# Altium footprint library PcbLib1.PcbLib: 157 footprints (part 5 of 10)
Each footprint in its own frame and in the unit in brackets; x right, y up, seen from the top. Pads: shape width x height; smd on the part's side, far side on the other; paste and mask are expansions set on the pad; w line width, h text height; cw(c..) or ccw(c..) is an arc to the next point about the centre after c.
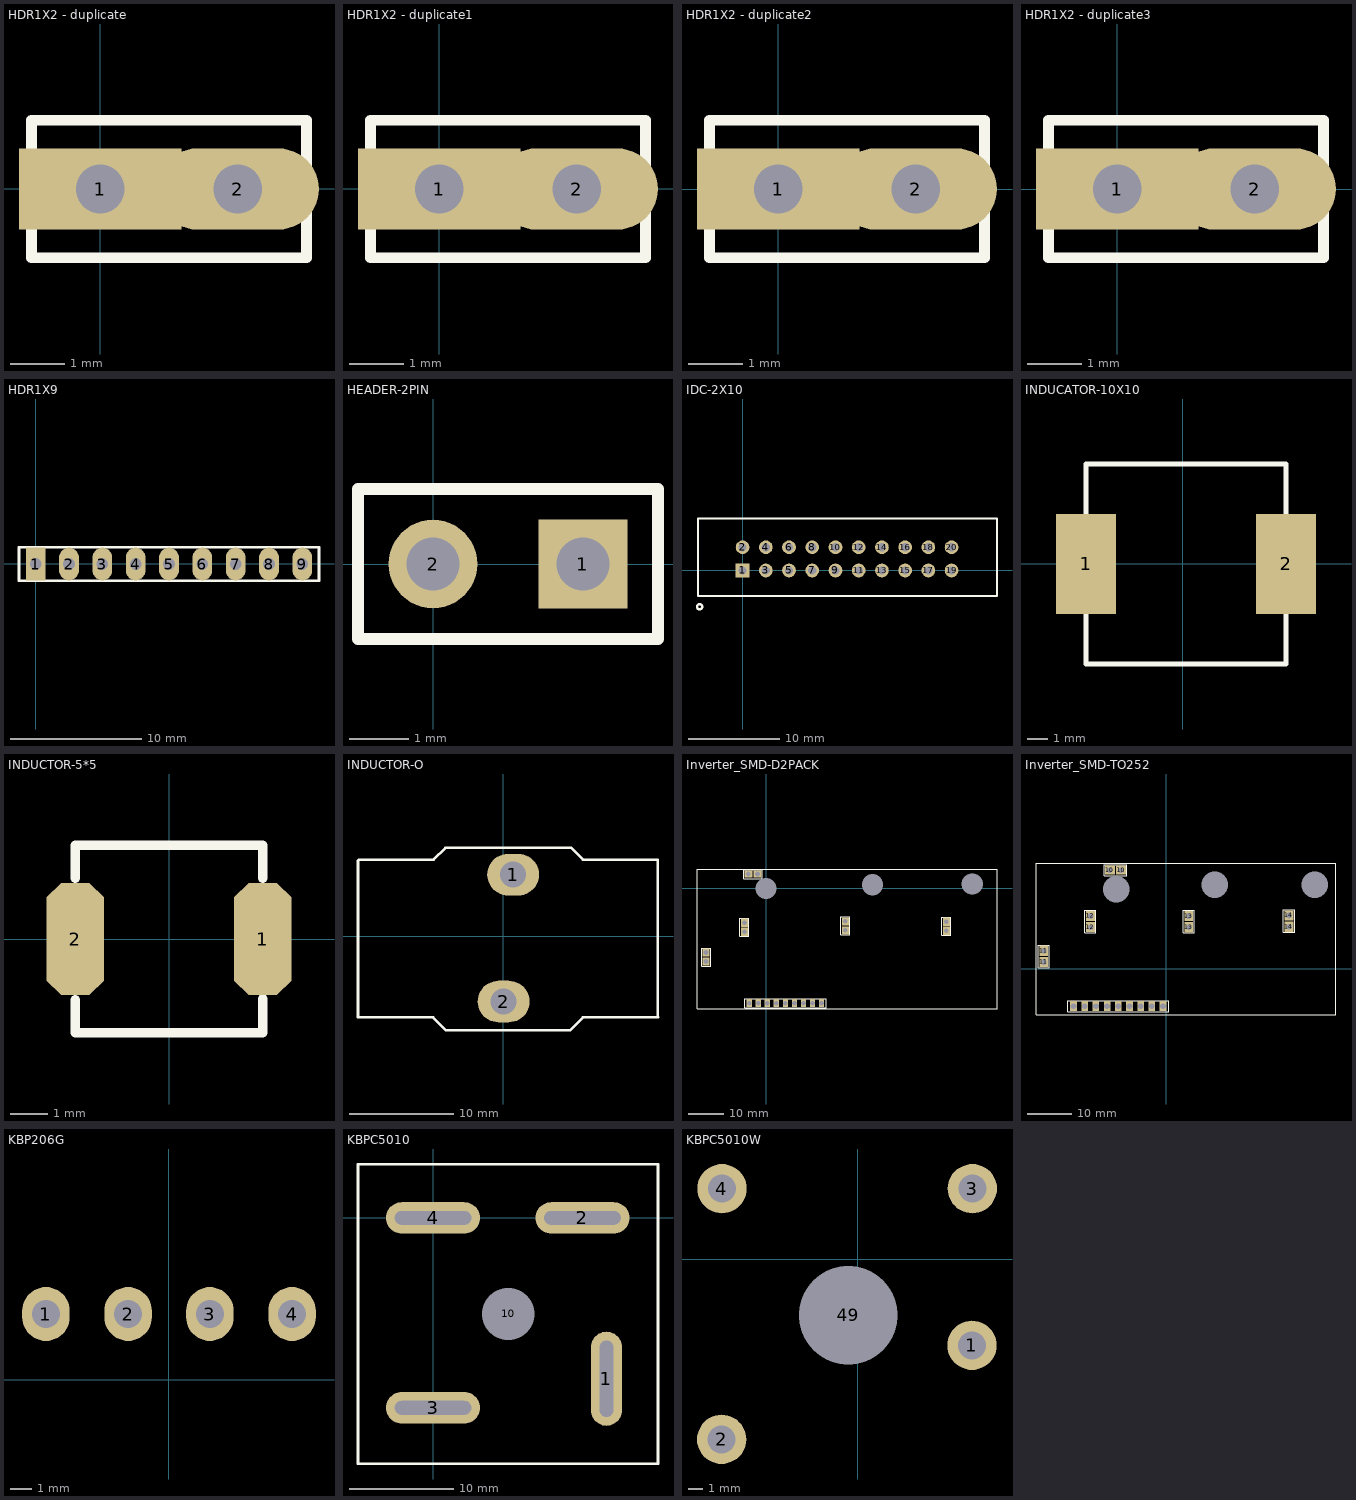
[diagram p4: the footprints below, top view; thin cyan lines are the x and y axes]

## HDR1X2 [mm] "Connector; Header; 2 Position"
height 1.12

## HDR1X2 - duplicate [mm] "Connector; Header; 2 Position"
height 1.12
pads (2):
  rect 3x1.5 hole 0.9: 1(0,0)
  oval 3x1.5 hole 0.9: 2(2.54,0)
Top Overlay:
  lines w0.2: -1.27,-1.27 3.81,-1.27 3.81,1.27 -1.27,1.27 -1.27,-1.27

## HDR1X2 - duplicate1 [mm] "Connector; Header; 2 Position"
height 1.12
pads (2):
  rect 3x1.5 hole 0.9: 1(0,0)
  oval 3x1.5 hole 0.9: 2(2.54,0)
Top Overlay:
  lines w0.2: -1.27,-1.27 -1.27,1.27 3.81,1.27 3.81,-1.27 -1.27,-1.27

## HDR1X2 - duplicate2 [mm] "Connector; Header; 2 Position"
height 1.12
pads (2):
  rect 3x1.5 hole 0.9: 1(0,0)
  oval 3x1.5 hole 0.9: 2(2.54,0)
Top Overlay:
  lines w0.2: -1.27,-1.27 -1.27,1.27 3.81,1.27 3.81,-1.27 -1.27,-1.27

## HDR1X2 - duplicate3 [mm] "Connector; Header; 2 Position"
height 1.12
pads (2):
  rect 3x1.5 hole 0.9: 1(0,0)
  oval 3x1.5 hole 0.9: 2(2.54,0)
Top Overlay:
  lines w0.2: -1.27,-1.27 -1.27,1.27 3.81,1.27 3.81,-1.27 -1.27,-1.27

## HDR1X9 [mm] "Connector; Header; 9 Position"
height 1.12
pads (9):
  rect 1.5x2.5 hole 0.9: 1(0,0)
  oval 1.5x2.5 hole 0.9: 2(2.54,0) 3(5.08,0) 4(7.62,0) 5(10.16,0) 6(12.7,0) 7(15.24,0) 8(17.78,0) 9(20.32,0)
Top Overlay:
  lines w0.2: -1.27,-1.27 21.59,-1.27 21.59,1.27 -1.27,1.27 -1.27,-1.27

## HEADER-2PIN [mm]
pads (2):
  rect 1.5x1.5 hole 0.9: 1(2.54,0)
  round 1.5 hole 0.9: 2(0,0)
Top Overlay:
  lines w0.2: -1.27,-1.27 3.81,-1.27 3.81,1.27 -1.27,1.27 -1.27,-1.27
3D body "User Library-Header_Male_2Pin.STEP": height 8.54, standoff -3, extent -1.27,-1.245 3.81,1.245

## IDC-2X10 [mm]
pads (20):
  rect 1.5x1.5 hole 0.9: 1(0,0)
  round 1.5 hole 0.9: 2(0,2.54) 3(2.54,0) 4(2.54,2.54) 5(5.08,0) 6(5.08,2.54) 7(7.62,0) 8(7.62,2.54) 9(10.16,0) 10(10.16,2.54) 11(12.7,0) 12(12.7,2.54) 13(15.24,0) 14(15.24,2.54) 15(17.78,0) 16(17.78,2.54) 17(20.32,0) 18(20.32,2.54) 19(22.86,0) 20(22.86,2.54)
Top Overlay:
  circle w0.254: c-4.7,-3.975 r0.285
  lines w0.2: -4.875,-2.775 -4.875,5.675 2.5,5.675 27.825,5.675 27.825,-2.775 2.14,-2.775 -4.875,-2.775
3D body "User Library-idc-20_asm.STEP": height 10, standoff -2.2, extent -4.875,-2.8 27.825,5.7

## INDUCATOR-10X10 [mm]
pads (2):
  rect 3x5 smd: 1(-4.828,-0.021) 2(5.172,-0.021)
Top Overlay:
  lines w0.254: -4.828,-5.025 5.172,-5.025 5.172,4.979 -4.828,4.979 -4.828,-5.025
3D body "SW3dPS-MSS1038.STEP": height 3.8, standoff -0.01, extent -4.96,-5.025 5.25,4.975

## INDUCTOR-5*5 [mm]
pads (2):
  oct 1.524x3 smd: 1(2.5,0) 2(-2.5,0)
Top Overlay:
  lines w0.254: -2.5,-1.625 -2.5,-2.5 2.5,-2.5 2.5,-1.6 ; -2.5,1.625 -2.5,2.5 2.5,2.5 2.5,1.625
3D body "User Library-CD54.STEP": height 4.5, standoff 0, extent -2.6,-3 2.6,2.916

## INDUCTOR-O [mm]
pads (2):
  oval 5x4 hole 2.5: 1(0.95,5.9) 2(0.025,-6.3)
Top Overlay:
  lines w0.254: -13.975,-7.825 -13.975,7.25 -13.875,7.35 -6.694,7.35 -5.569,8.475 6.544,8.475 7.669,7.35 14.85,7.35 14.85,-7.8 14.875,-7.825 7.662,-7.825 6.438,-9.05 -5.538,-9.05 -6.763,-7.825 -13.975,-7.825
3D body "User Library-T104-52-FM27-56uH.STEP": height 31.4, standoff -3, extent -13.925,-7.782 14.875,7.332

## Inverter_SMD-D2PACK [mm]
pads (22):
  round 0 hole 6: 0(0,0) 0(29.972,1.016) 0(58.039,1.27)
  rect 1.5x2.3 hole 1.3: 1(-4.699,-32.258) 2(-2.159,-32.258) 3(0.381,-32.258) 4(2.921,-32.258) 5(5.461,-32.258) 6(8.001,-32.258) 7(10.541,-32.258) 8(13.081,-32.258) 9(15.621,-32.258)
  rect 2.3x2 hole 1.3: 10(-4.953,4.064) 10(-2.413,4.064)
  rect 2x2.3 hole 1.3: 11(-16.891,-20.574) 11(-16.891,-18.034) 12(-6.073,-12.169) 12(-6.073,-9.629) 13(22.352,-11.811) 13(22.352,-9.271) 14(50.782,-11.887) 14(50.782,-9.347)
Top Overlay:
  lines w0.2: -18.161,-21.844 -18.161,-16.764 -15.621,-16.764 -15.621,-21.844 -18.161,-21.844 ; -7.343,-13.439 -4.803,-13.439 -4.803,-8.359 -7.343,-8.359 -7.343,-13.439 ; -6.223,2.794 -6.223,5.334 -1.041,5.334 -1.041,2.794 -6.223,2.794 ; -5.969,-33.528 -5.969,-30.988 16.891,-30.988 16.891,-33.528 -5.969,-33.528 ; 21.082,-13.081 23.622,-13.081 23.622,-8.001 21.082,-8.001 21.082,-13.081 ; 49.512,-13.157 52.052,-13.157 52.052,-8.077 49.512,-8.077 49.512,-13.157
  lines w0.254: -19.431,-33.909 -19.431,5.461 65.024,5.461 65.024,-33.909 -19.431,-33.909

## Inverter_SMD-TO252 [mm]
pads (22):
  round 0 hole 6: 0(-11.436,17.998) 0(10.916,19.014) 0(33.649,19.014)
  rect 1.5x2.3 hole 1.3: 1(-21.088,-8.545) 2(-18.548,-8.545) 3(-16.008,-8.545) 4(-13.468,-8.545) 5(-10.928,-8.545) 6(-8.388,-8.545) 7(-5.848,-8.545) 8(-3.308,-8.545) 9(-0.768,-8.545)
  rect 2.3x2 hole 1.3: 10(-12.833,22.316) 10(-10.293,22.316)
  rect 2x2.3 hole 1.3: 11(-27.819,1.488) 11(-27.819,4.028) 12(-17.255,9.385) 12(-17.255,11.925) 13(5.074,9.362) 13(5.074,11.902) 14(27.807,9.489) 14(27.807,12.029)
Top Overlay:
  lines w0.2: -29.089,0.218 -26.549,0.218 -26.549,5.298 -29.089,5.298 -29.089,0.218 ; -22.358,-9.815 0.502,-9.815 0.502,-7.275 -22.358,-7.275 -22.358,-9.815 ; -18.525,8.115 -18.525,13.195 -15.985,13.195 -15.985,8.115 -18.525,8.115 ; -14.103,21.046 -9.023,21.046 -9.023,23.586 -14.103,23.586 -14.103,21.046 ; 3.804,8.092 3.804,13.172 6.344,13.172 6.344,8.092 3.804,8.092 ; 26.537,8.219 26.537,13.299 29.077,13.299 29.077,8.219 26.537,8.219
  lines w0.254: -29.597,-10.45 38.475,-10.45 38.475,23.84 -29.597,23.84 -29.597,-10.45

## KBP206G [mm]
pads (4):
  oval 2.2x2.5 hole 1.3: 1(-5.69,3.048) 2(-1.88,3.048) 3(1.905,3.048) 4(5.715,3.048)
3D body "User Library-KBPM.STEP": height 11.5, standoff -12.7, extent -7.289,0.797 7.29,5.807

## KBPC5010 [mm]
pads (5):
  oval 3x9 hole 1.3 slot 7.3 at 90 deg: 1(16.575,-15.375)
  oval 9x3 hole 1.3 slot 7.3 at 0 deg: 2(14.275,0) 3(0,-18.15) 4(0,0)
  round 1.6 hole 5: 10(7.188,-9.188)
Top Overlay:
  lines w0.254: -7.125,5.125 -7.175,5.125 ; 21.45,5.125 21.5,5.125 ; -7.175,5.125 21.5,5.125 ; -7.175,5.125 -7.175,-23.4 -7.175,-23.5 21.5,-23.5 21.5,5.125
3D body "User Library-Bridge KBPC 5012 F.STEP": height 14.5, standoff -7.5, extent -7.175,-23.5 21.425,5.1

## KBPC5010W [mm]
pads (5):
  round 3.5 hole 2: 1(8.1,-6.125) 2(-9.675,-12.8) 3(8.125,5) 4(-9.65,5)
  oval 1.6x2 hole 7: 49(-0.7,-3.975)
3D body "User Library-BD5010W.STEP": height 11.5, standoff -4.5, extent -14.7,-17.975 13.31,10.025